# Altium footprint library SAMTEC THD.PcbLib: 161 footprints (part 3 of 12)
Each footprint in its own frame and in the unit in brackets; x right, y up, seen from the top. Pads: shape width x height; smd on the part's side, far side on the other; paste and mask are expansions set on the pad; w line width, h text height; cw(c..) or ccw(c..) is an arc to the next point about the centre after c.
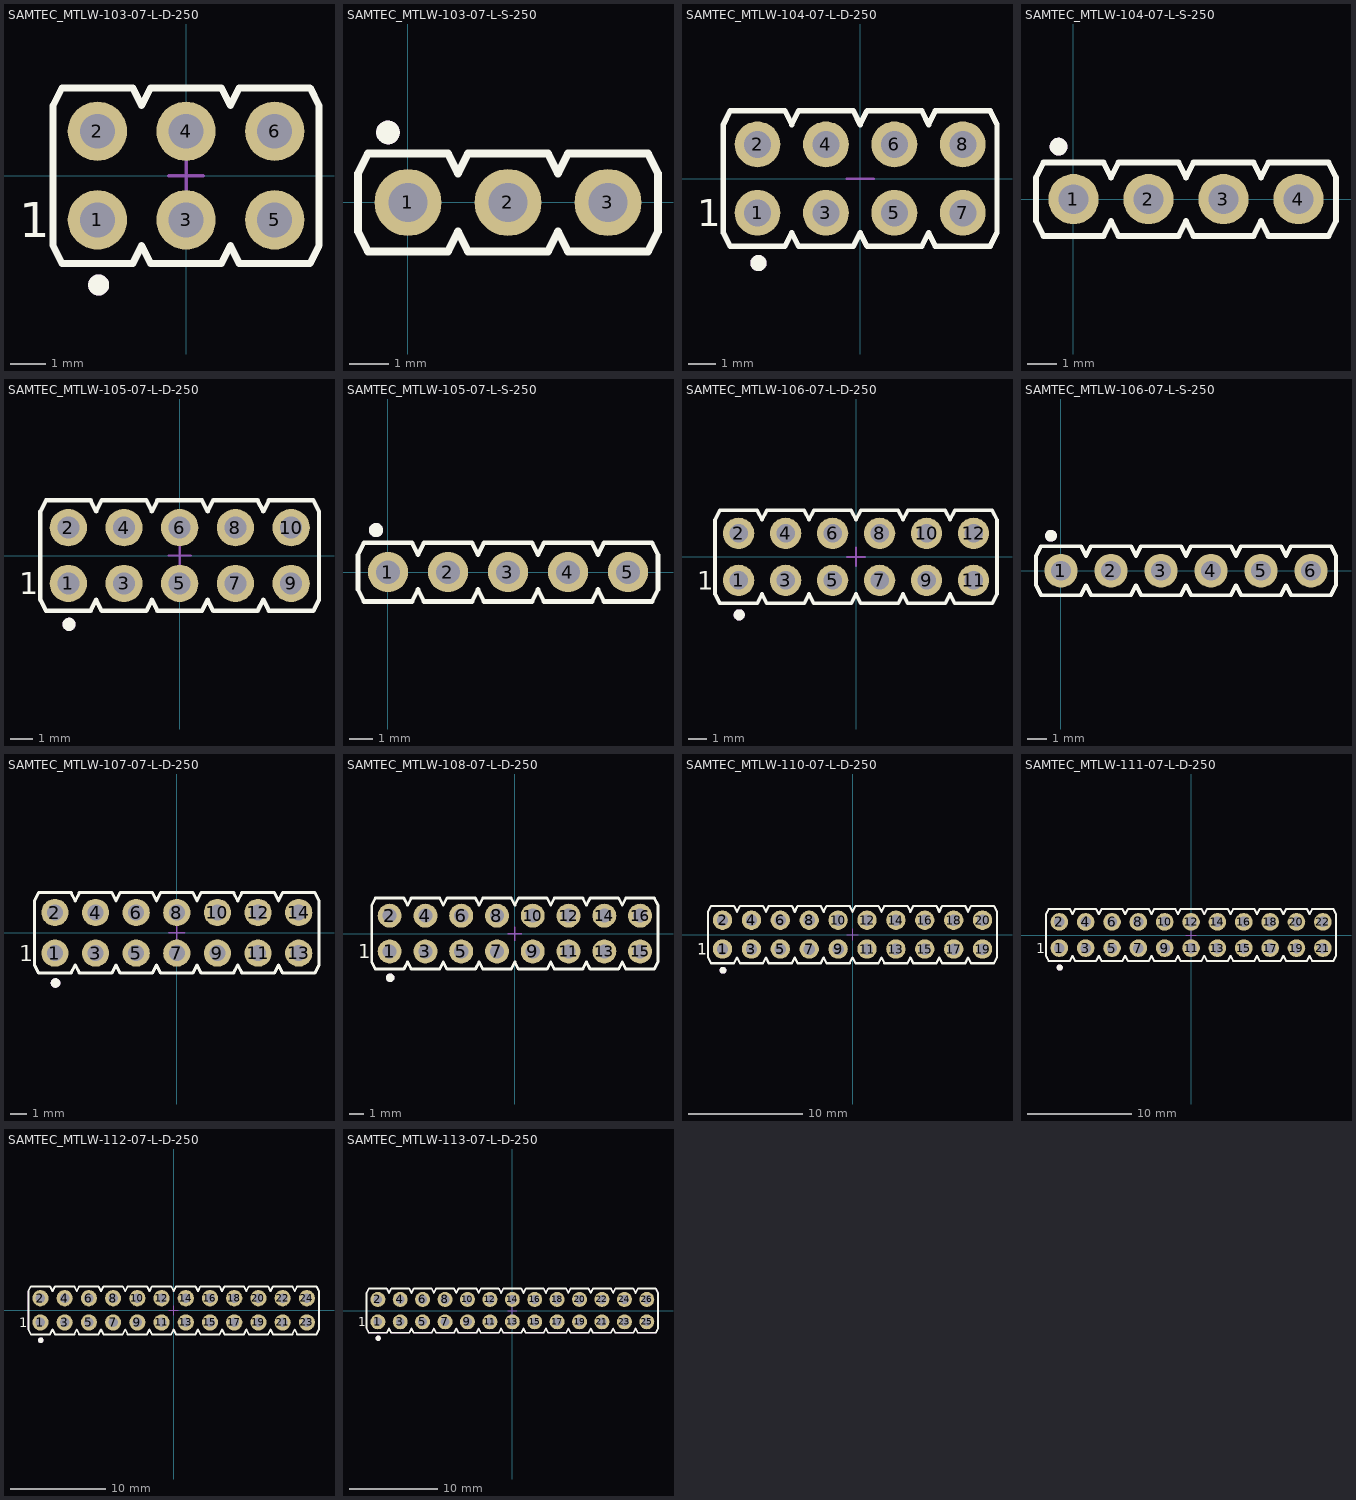
[diagram p2: the footprints below, top view; thin cyan lines are the x and y axes]

## SAMTEC_MTLW-103-07-L-D-250 [mm] "6 Contacts - Pitch 2.54mm - Dual Row Through Mount Straight Header (Post Lead = 6.35mm, Tail Lead 3.05mm, Insulator 1.52mm)"
height 7.87
pads (6):
  round 1.7 hole 1: 1(-2.54,-1.27) 2(-2.54,1.27) 3(0,-1.27) 4(0,1.27) 5(2.54,-1.27) 6(2.54,1.27)
Top Overlay:
  circle w0.3: c-2.505,-3.135 r0.15
  lines w0.2: 3.81,-2.007 3.81,2.007 ; 3.81,-2.007 3.556,-2.515 1.524,-2.515 1.27,-2.007 1.016,-2.515 -1.016,-2.515 -1.27,-2.007 -1.524,-2.515 -3.556,-2.515 -3.81,-2.007 -3.81,2.007 -3.556,2.515 -1.524,2.515 -1.27,2.007 -1.016,2.515 1.016,2.515 1.27,2.007 1.524,2.515 3.556,2.515 3.81,2.007 ; 3.81,-2.007 3.81,2.007
  text "1" at -4.787,-1.768 h1
Mechanical 8:
  lines w0.1: -3.04,-1.27 -2.54,-1.27 ; -3.04,1.27 -2.54,1.27 ; -2.54,-1.77 -2.54,-1.27 ; -2.54,-0.77 -2.54,-1.27 ; -2.54,0.77 -2.54,1.27 ; -2.54,1.77 -2.54,1.27 ; -2.04,-1.27 -2.54,-1.27 ; -2.04,1.27 -2.54,1.27 ; -0.5,-1.27 0,-1.27 ; -0.5,0 0,0 ; -0.5,1.27 0,1.27 ; 0,-1.77 0,-1.27 ; 0,-0.77 0,-1.27 ; 0,-0.5 0,0 ; 0,0.5 0,0 ; 0,0.77 0,1.27 ; 0,1.77 0,1.27 ; 0.5,-1.27 0,-1.27 ; 0.5,0 0,0 ; 0.5,1.27 0,1.27 ; 2.04,-1.27 2.54,-1.27 ; 2.04,1.27 2.54,1.27 ; 2.54,-1.77 2.54,-1.27 ; 2.54,-0.77 2.54,-1.27 ; 2.54,0.77 2.54,1.27 ; 2.54,1.77 2.54,1.27 ; 3.04,-1.27 2.54,-1.27 ; 3.04,1.27 2.54,1.27
Mechanical 14:
  circle w0.3: c-2.505,-3.135 r0.15
  lines w0.1: 3.81,-2.007 3.81,2.007 ; 3.81,-2.007 3.556,-2.515 1.524,-2.515 1.27,-2.007 1.016,-2.515 -1.016,-2.515 -1.27,-2.007 -1.524,-2.515 -3.556,-2.515 -3.81,-2.007 -3.81,2.007 -3.556,2.515 -1.524,2.515 -1.27,2.007 -1.016,2.515 1.016,2.515 1.27,2.007 1.524,2.515 3.556,2.515 3.81,2.007 ; 3.81,-2.007 3.81,2.007 ; -2.858,-1.587 -2.222,-1.587 -2.222,-0.953 -2.858,-0.953 -2.858,-1.587 ; -2.858,0.953 -2.222,0.953 -2.222,1.587 -2.858,1.587 -2.858,0.953 ; -0.318,-1.587 0.318,-1.587 0.318,-0.953 -0.318,-0.953 -0.318,-1.587 ; -0.318,0.953 0.318,0.953 0.318,1.587 -0.318,1.587 -0.318,0.953 ; 2.222,-1.587 2.858,-1.587 2.858,-0.953 2.222,-0.953 2.222,-1.587 ; 2.222,0.953 2.858,0.953 2.858,1.587 2.222,1.587 2.222,0.953
  text "1" at -4.787,-1.768 h1
3D body "SAMTEC_MTLW-103-07-L-D-250.stp": height 7.87, standoff -3.05, extent -3.81,-2.514 3.81,2.515

## SAMTEC_MTLW-103-07-L-S-250 [mm] "3 Contacts - Pitch 2.54mm - Single Row Through Mount Straight Header (Post Lead = 6.35mm, Tail Lead 3.05mm, Insulator 1.52mm)"
height 7.87
pads (3):
  round 1.7 hole 1: 1(0,0) 2(2.54,0) 3(5.08,0)
Top Overlay:
  circle w0.3: c-0.508,1.778 r0.15
  lines w0.2: -1.27,-0.737 -1.016,-1.245 1.016,-1.245 1.27,-0.737 1.524,-1.245 3.556,-1.245 3.81,-0.737 4.064,-1.245 6.096,-1.245 6.35,-0.737 6.35,0.737 6.096,1.245 4.064,1.245 3.81,0.737 3.556,1.245 1.524,1.245 1.27,0.737 1.016,1.245 -1.016,1.245 -1.27,0.737 -1.27,-0.737
Mechanical 8:
  lines w0.1: -0.5,0 0,0 ; 0,-0.5 0,0 ; 0,0.5 0,0 ; 0.5,0 0,0 ; 2.04,0 2.54,0 ; 2.54,-0.5 2.54,0 ; 2.54,0.5 2.54,0 ; 3.04,0 2.54,0 ; 4.58,0 5.08,0 ; 5.08,-0.5 5.08,0 ; 5.08,0.5 5.08,0 ; 5.58,0 5.08,0
Mechanical 14:
  circle w0.3: c-0.508,1.778 r0.15
  lines w0.1: -1.27,-0.737 -1.27,0.737 -1.016,1.245 1.016,1.245 1.27,0.737 1.524,1.245 3.556,1.245 3.81,0.737 4.064,1.245 6.096,1.245 6.35,0.737 6.35,-0.737 6.096,-1.245 4.064,-1.245 3.81,-0.737 3.556,-1.245 1.524,-1.245 1.27,-0.737 1.016,-1.245 -1.016,-1.245 -1.27,-0.737 ; -0.317,-0.318 -0.317,0.318 0.318,0.318 0.318,-0.318 -0.317,-0.318 ; 2.223,-0.318 2.223,0.318 2.858,0.318 2.858,-0.318 2.223,-0.318 ; 4.763,-0.318 4.763,0.318 5.398,0.318 5.398,-0.318 4.763,-0.318
3D body "SAMTEC_MTLW-103-07-L-S-250.stp": height 7.87, standoff -3.05, extent -1.27,-1.244 6.35,1.245

## SAMTEC_MTLW-104-07-L-D-250 [mm] "8 Contacts - Pitch 2.54mm - Dual Row Through Mount Straight Header (Post Lead = 6.35mm, Tail Lead 3.05mm, Insulator 1.52mm)"
height 7.87
pads (8):
  round 1.7 hole 1: 1(-3.81,-1.27) 2(-3.81,1.27) 3(-1.27,-1.27) 4(-1.27,1.27) 5(1.27,-1.27) 6(1.27,1.27) 7(3.81,-1.27) 8(3.81,1.27)
Top Overlay:
  circle w0.3: c-3.775,-3.135 r0.15
  lines w0.2: 5.08,-2.007 5.08,2.007 ; 5.08,-2.007 4.826,-2.515 2.794,-2.515 2.54,-2.007 2.286,-2.515 0.254,-2.515 0,-2.007 -0.254,-2.515 -2.286,-2.515 -2.54,-2.007 -2.794,-2.515 -4.826,-2.515 -5.08,-2.007 -5.08,2.007 -4.826,2.515 -2.794,2.515 -2.54,2.007 -2.286,2.515 -0.254,2.515 0,2.007 0.254,2.515 2.286,2.515 2.54,2.007 2.794,2.515 4.826,2.515 5.08,2.007 ; 5.08,-2.007 5.08,2.007
  text "1" at -6.057,-1.768 h1
Mechanical 8:
  lines w0.1: -4.31,-1.27 -3.81,-1.27 ; -4.31,1.27 -3.81,1.27 ; -3.81,-1.77 -3.81,-1.27 ; -3.81,-0.77 -3.81,-1.27 ; -3.81,0.77 -3.81,1.27 ; -3.81,1.77 -3.81,1.27 ; -3.31,-1.27 -3.81,-1.27 ; -3.31,1.27 -3.81,1.27 ; -1.77,-1.27 -1.27,-1.27 ; -1.77,1.27 -1.27,1.27 ; -1.27,-1.77 -1.27,-1.27 ; -1.27,-0.77 -1.27,-1.27 ; -1.27,0.77 -1.27,1.27 ; -1.27,1.77 -1.27,1.27 ; -0.77,-1.27 -1.27,-1.27 ; -0.77,1.27 -1.27,1.27 ; -0.5,0 0,0 0.5,0 ; 0.77,-1.27 1.27,-1.27 ; 0.77,1.27 1.27,1.27 ; 1.27,-1.77 1.27,-1.27 ; 1.27,-0.77 1.27,-1.27 ; 1.27,0.77 1.27,1.27 ; 1.27,1.77 1.27,1.27 ; 1.77,-1.27 1.27,-1.27 ; 1.77,1.27 1.27,1.27 ; 3.31,-1.27 3.81,-1.27 ; 3.31,1.27 3.81,1.27 ; 3.81,-1.77 3.81,-1.27 ; 3.81,-0.77 3.81,-1.27 ; 3.81,0.77 3.81,1.27 ; 3.81,1.77 3.81,1.27 ; 4.31,-1.27 3.81,-1.27 ; 4.31,1.27 3.81,1.27
Mechanical 14:
  circle w0.3: c-3.775,-3.135 r0.15
  lines w0.1: 5.08,-2.007 5.08,2.007 ; 5.08,-2.007 4.826,-2.515 2.794,-2.515 2.54,-2.007 2.286,-2.515 0.254,-2.515 0,-2.007 -0.254,-2.515 -2.286,-2.515 -2.54,-2.007 -2.794,-2.515 -4.826,-2.515 -5.08,-2.007 -5.08,2.007 -4.826,2.515 -2.794,2.515 -2.54,2.007 -2.286,2.515 -0.254,2.515 0,2.007 0.254,2.515 2.286,2.515 2.54,2.007 2.794,2.515 4.826,2.515 5.08,2.007 ; 5.08,-2.007 5.08,2.007 ; -4.128,-1.587 -4.128,-0.953 -3.493,-0.953 -3.493,-1.587 -4.128,-1.587 ; -4.128,0.953 -4.128,1.587 -3.493,1.587 -3.493,0.953 -4.128,0.953 ; -1.587,-1.587 -1.587,-0.953 -0.953,-0.953 -0.953,-1.587 -1.587,-1.587 ; -1.587,0.953 -1.587,1.587 -0.953,1.587 -0.953,0.953 -1.587,0.953 ; 0.953,-1.587 0.953,-0.953 1.587,-0.953 1.587,-1.587 0.953,-1.587 ; 0.953,0.953 0.953,1.587 1.587,1.587 1.587,0.953 0.953,0.953 ; 3.493,-1.587 3.493,-0.953 4.128,-0.953 4.128,-1.587 3.493,-1.587 ; 3.493,0.953 3.493,1.587 4.128,1.587 4.128,0.953 3.493,0.953
  text "1" at -6.057,-1.768 h1
3D body "SAMTEC_MTLW-104-07-L-D-250.stp": height 7.87, standoff -3.05, extent -5.08,-2.514 5.08,2.515

## SAMTEC_MTLW-104-07-L-S-250 [mm] "4 Contacts - Pitch 2.54mm - Single Row Through Mount Straight Header (Post Lead = 6.35mm, Tail Lead 3.05mm, Insulator 1.52mm)"
height 7.87
pads (4):
  round 1.7 hole 1: 1(0,0) 2(2.54,0) 3(5.08,0) 4(7.62,0)
Top Overlay:
  circle w0.3: c-0.508,1.778 r0.15
  lines w0.2: -1.27,-0.737 -1.27,0.737 -1.016,1.245 1.016,1.245 1.27,0.737 1.524,1.245 3.556,1.245 3.81,0.737 4.064,1.245 6.096,1.245 6.35,0.737 6.604,1.245 8.636,1.245 8.89,0.737 8.89,-0.737 8.636,-1.245 6.604,-1.245 6.35,-0.737 6.096,-1.245 4.064,-1.245 3.81,-0.737 3.556,-1.245 1.524,-1.245 1.27,-0.737 1.016,-1.245 -1.016,-1.245 -1.27,-0.737
Mechanical 8:
  lines w0.1: -0.5,0 0,0 ; 0,-0.5 0,0 ; 0,0.5 0,0 ; 0.5,0 0,0 ; 2.04,0 2.54,0 ; 2.54,-0.5 2.54,0 ; 2.54,0.5 2.54,0 ; 3.04,0 2.54,0 ; 4.58,0 5.08,0 ; 5.08,-0.5 5.08,0 ; 5.08,0.5 5.08,0 ; 5.58,0 5.08,0 ; 7.12,0 7.62,0 ; 7.62,-0.5 7.62,0 ; 7.62,0.5 7.62,0 ; 8.12,0 7.62,0
Mechanical 14:
  circle w0.3: c-0.508,1.778 r0.15
  lines w0.1: -1.27,-0.737 -1.016,-1.245 1.016,-1.245 1.27,-0.737 1.524,-1.245 3.556,-1.245 3.81,-0.737 4.064,-1.245 6.096,-1.245 6.35,-0.737 6.604,-1.245 8.636,-1.245 8.89,-0.737 8.89,0.737 8.636,1.245 6.604,1.245 6.35,0.737 6.096,1.245 4.064,1.245 3.81,0.737 3.556,1.245 1.524,1.245 1.27,0.737 1.016,1.245 -1.016,1.245 -1.27,0.737 -1.27,-0.737 ; -0.317,-0.318 0.318,-0.318 0.318,0.318 -0.317,0.318 -0.317,-0.318 ; 2.223,-0.318 2.858,-0.318 2.858,0.318 2.223,0.318 2.223,-0.318 ; 4.763,-0.318 5.398,-0.318 5.398,0.318 4.763,0.318 4.763,-0.318 ; 7.303,-0.318 7.938,-0.318 7.938,0.318 7.303,0.318 7.303,-0.318
3D body "SAMTEC_MTLW-104-07-L-S-250.stp": height 7.87, standoff -3.05, extent -1.27,-1.244 8.89,1.245

## SAMTEC_MTLW-105-07-L-D-250 [mm] "10 Contacts - Pitch 2.54mm - Dual Row Through Mount Straight Header (Post Lead = 6.35mm, Tail Lead 3.05mm, Insulator 1.52mm)"
height 7.87
pads (10):
  round 1.7 hole 1: 1(-5.08,-1.27) 2(-5.08,1.27) 3(-2.54,-1.27) 4(-2.54,1.27) 5(0,-1.27) 6(0,1.27) 7(2.54,-1.27) 8(2.54,1.27) 9(5.08,-1.27) 10(5.08,1.27)
Top Overlay:
  circle w0.3: c-5.045,-3.135 r0.15
  lines w0.2: -6.35,-2.007 -6.096,-2.515 -4.064,-2.515 -3.81,-2.007 -3.556,-2.515 -1.524,-2.515 -1.27,-2.007 -1.016,-2.515 1.016,-2.515 1.27,-2.007 1.524,-2.515 3.556,-2.515 3.81,-2.007 4.064,-2.515 6.096,-2.515 6.35,-2.007 6.35,2.007 6.096,2.515 4.064,2.515 3.81,2.007 3.556,2.515 1.524,2.515 1.27,2.007 1.016,2.515 -1.016,2.515 -1.27,2.007 -1.524,2.515 -3.556,2.515 -3.81,2.007 -4.064,2.515 -6.096,2.515 -6.35,2.007 -6.35,-2.007
  text "1" at -7.327,-1.768 h1
Mechanical 8:
  lines w0.1: -5.58,-1.27 -5.08,-1.27 ; -5.58,1.27 -5.08,1.27 ; -5.08,-1.77 -5.08,-1.27 ; -5.08,-0.77 -5.08,-1.27 ; -5.08,0.77 -5.08,1.27 ; -5.08,1.77 -5.08,1.27 ; -4.58,-1.27 -5.08,-1.27 ; -4.58,1.27 -5.08,1.27 ; -3.04,-1.27 -2.54,-1.27 ; -3.04,1.27 -2.54,1.27 ; -2.54,-1.77 -2.54,-1.27 ; -2.54,-0.77 -2.54,-1.27 ; -2.54,0.77 -2.54,1.27 ; -2.54,1.77 -2.54,1.27 ; -2.04,-1.27 -2.54,-1.27 ; -2.04,1.27 -2.54,1.27 ; -0.5,-1.27 0,-1.27 ; -0.5,0 0,0 ; -0.5,1.27 0,1.27 ; 0,-1.77 0,-1.27 ; 0,-0.77 0,-1.27 ; 0,-0.5 0,0 ; 0,0.5 0,0 ; 0,0.77 0,1.27 ; 0,1.77 0,1.27 ; 0.5,-1.27 0,-1.27 ; 0.5,0 0,0 ; 0.5,1.27 0,1.27 ; 2.04,-1.27 2.54,-1.27 ; 2.04,1.27 2.54,1.27 ; 2.54,-1.77 2.54,-1.27 ; 2.54,-0.77 2.54,-1.27 ; 2.54,0.77 2.54,1.27 ; 2.54,1.77 2.54,1.27 ; 3.04,-1.27 2.54,-1.27 ; 3.04,1.27 2.54,1.27 ; 4.58,-1.27 5.08,-1.27 ; 4.58,1.27 5.08,1.27 ; 5.08,-1.77 5.08,-1.27 ; 5.08,-0.77 5.08,-1.27 ; 5.08,0.77 5.08,1.27 ; 5.08,1.77 5.08,1.27 ; 5.58,-1.27 5.08,-1.27 ; 5.58,1.27 5.08,1.27
Mechanical 14:
  circle w0.3: c-5.045,-3.135 r0.15
  lines w0.1: -6.35,-2.007 -6.096,-2.515 -4.064,-2.515 -3.81,-2.007 -3.556,-2.515 -1.524,-2.515 -1.27,-2.007 -1.016,-2.515 1.016,-2.515 1.27,-2.007 1.524,-2.515 3.556,-2.515 3.81,-2.007 4.064,-2.515 6.096,-2.515 6.35,-2.007 6.35,2.007 6.096,2.515 4.064,2.515 3.81,2.007 3.556,2.515 1.524,2.515 1.27,2.007 1.016,2.515 -1.016,2.515 -1.27,2.007 -1.524,2.515 -3.556,2.515 -3.81,2.007 -4.064,2.515 -6.096,2.515 -6.35,2.007 -6.35,-2.007 ; -5.397,-1.587 -4.762,-1.587 -4.762,-0.953 -5.397,-0.953 -5.397,-1.587 ; -5.397,0.953 -4.762,0.953 -4.762,1.587 -5.397,1.587 -5.397,0.953 ; -2.857,-1.587 -2.222,-1.587 -2.222,-0.953 -2.857,-0.953 -2.857,-1.587 ; -2.857,0.953 -2.222,0.953 -2.222,1.587 -2.857,1.587 -2.857,0.953 ; -0.317,-1.587 0.318,-1.587 0.318,-0.953 -0.317,-0.953 -0.317,-1.587 ; -0.317,0.953 0.318,0.953 0.318,1.587 -0.317,1.587 -0.317,0.953 ; 2.223,-1.587 2.858,-1.587 2.858,-0.953 2.223,-0.953 2.223,-1.587 ; 2.223,0.953 2.858,0.953 2.858,1.587 2.223,1.587 2.223,0.953 ; 4.763,-1.587 5.398,-1.587 5.398,-0.953 4.763,-0.953 4.763,-1.587 ; 4.763,0.953 5.398,0.953 5.398,1.587 4.763,1.587 4.763,0.953
  text "1" at -7.327,-1.768 h1
3D body "SAMTEC_MTLW-105-07-L-D-250.stp": height 7.87, standoff -3.05, extent -6.35,-2.514 6.35,2.515

## SAMTEC_MTLW-105-07-L-S-250 [mm] "5 Contacts - Pitch 2.54mm - Single Row Through Mount Straight Header (Post Lead = 6.35mm, Tail Lead 3.05mm, Insulator 1.52mm)"
height 7.87
pads (5):
  round 1.7 hole 1: 1(0,0) 2(2.54,0) 3(5.08,0) 4(7.62,0) 5(10.16,0)
Top Overlay:
  circle w0.3: c-0.508,1.778 r0.15
  lines w0.2: -1.27,-0.737 -1.27,0.737 -1.016,1.245 1.016,1.245 1.27,0.737 1.524,1.245 3.556,1.245 3.81,0.737 4.064,1.245 6.096,1.245 6.35,0.737 6.604,1.245 8.636,1.245 8.89,0.737 9.144,1.245 11.176,1.245 11.43,0.737 11.43,-0.737 11.176,-1.245 9.144,-1.245 8.89,-0.737 8.636,-1.245 6.604,-1.245 6.35,-0.737 6.096,-1.245 4.064,-1.245 3.81,-0.737 3.556,-1.245 1.524,-1.245 1.27,-0.737 1.016,-1.245 -1.016,-1.245 -1.27,-0.737
Mechanical 8:
  lines w0.1: -0.5,0 0,0 ; 0,-0.5 0,0 ; 0,0.5 0,0 ; 0.5,0 0,0 ; 2.04,0 2.54,0 ; 2.54,-0.5 2.54,0 ; 2.54,0.5 2.54,0 ; 3.04,0 2.54,0 ; 4.58,0 5.08,0 ; 5.08,-0.5 5.08,0 ; 5.08,0.5 5.08,0 ; 5.58,0 5.08,0 ; 7.12,0 7.62,0 ; 7.62,-0.5 7.62,0 ; 7.62,0.5 7.62,0 ; 8.12,0 7.62,0 ; 9.66,0 10.16,0 ; 10.16,-0.5 10.16,0 ; 10.16,0.5 10.16,0 ; 10.66,0 10.16,0
Mechanical 14:
  circle w0.3: c-0.508,1.778 r0.15
  lines w0.1: -1.27,-0.737 -1.27,0.737 -1.016,1.245 1.016,1.245 1.27,0.737 1.524,1.245 3.556,1.245 3.81,0.737 4.064,1.245 6.096,1.245 6.35,0.737 6.604,1.245 8.636,1.245 8.89,0.737 9.144,1.245 11.176,1.245 11.43,0.737 11.43,-0.737 11.176,-1.245 9.144,-1.245 8.89,-0.737 8.636,-1.245 6.604,-1.245 6.35,-0.737 6.096,-1.245 4.064,-1.245 3.81,-0.737 3.556,-1.245 1.524,-1.245 1.27,-0.737 1.016,-1.245 -1.016,-1.245 -1.27,-0.737 ; -0.317,-0.318 -0.317,0.318 0.318,0.318 0.318,-0.318 -0.317,-0.318 ; 2.223,-0.318 2.223,0.318 2.858,0.318 2.858,-0.318 2.223,-0.318 ; 4.763,-0.318 4.763,0.318 5.398,0.318 5.398,-0.318 4.763,-0.318 ; 7.303,-0.318 7.303,0.318 7.938,0.318 7.938,-0.318 7.303,-0.318 ; 9.843,-0.318 10.478,-0.318 10.478,0.318 9.843,0.318 9.843,-0.318
3D body "SAMTEC_MTLW-105-07-L-S-250.stp": height 7.87, standoff -3.05, extent -1.27,-1.244 11.43,1.245

## SAMTEC_MTLW-106-07-L-D-250 [mm] "12 Contacts - Pitch 2.54mm - Dual Row Through Mount Straight Header (Post Lead = 6.35mm, Tail Lead 3.05mm, Insulator 1.52mm)"
height 7.87
pads (12):
  round 1.7 hole 1: 1(-6.35,-1.27) 2(-6.35,1.27) 3(-3.81,-1.27) 4(-3.81,1.27) 5(-1.27,-1.27) 6(-1.27,1.27) 7(1.27,-1.27) 8(1.27,1.27) 9(3.81,-1.27) 10(3.81,1.27) 11(6.35,-1.27) 12(6.35,1.27)
Top Overlay:
  circle w0.3: c-6.315,-3.135 r0.15
  lines w0.2: -7.62,-2.007 -7.366,-2.515 -5.334,-2.515 -5.08,-2.007 -4.826,-2.515 -2.794,-2.515 -2.54,-2.007 -2.286,-2.515 -0.254,-2.515 0,-2.007 0.254,-2.515 2.286,-2.515 2.54,-2.007 2.794,-2.515 4.826,-2.515 5.08,-2.007 5.334,-2.515 7.366,-2.515 7.62,-2.007 ; -7.62,-2.007 -7.62,2.007 ; -7.62,-2.007 -7.62,2.007 ; -7.62,2.007 -7.366,2.515 -5.334,2.515 -5.08,2.007 -4.826,2.515 -2.794,2.515 -2.54,2.007 -2.286,2.515 -0.254,2.515 0,2.007 0.254,2.515 2.286,2.515 2.54,2.007 2.794,2.515 4.826,2.515 5.08,2.007 5.334,2.515 7.366,2.515 7.62,2.007 ; 7.62,-2.007 7.62,2.007 ; 7.62,-2.007 7.62,2.007
  text "1" at -8.597,-1.768 h1
Mechanical 8:
  lines w0.1: -6.85,-1.27 -6.35,-1.27 ; -6.85,1.27 -6.35,1.27 ; -6.35,-1.77 -6.35,-1.27 ; -6.35,-0.77 -6.35,-1.27 ; -6.35,0.77 -6.35,1.27 ; -6.35,1.77 -6.35,1.27 ; -5.85,-1.27 -6.35,-1.27 ; -5.85,1.27 -6.35,1.27 ; -4.31,-1.27 -3.81,-1.27 ; -4.31,1.27 -3.81,1.27 ; -3.81,-1.77 -3.81,-1.27 ; -3.81,-0.77 -3.81,-1.27 ; -3.81,0.77 -3.81,1.27 ; -3.81,1.77 -3.81,1.27 ; -3.31,-1.27 -3.81,-1.27 ; -3.31,1.27 -3.81,1.27 ; -1.77,-1.27 -1.27,-1.27 ; -1.77,1.27 -1.27,1.27 ; -1.27,-1.77 -1.27,-1.27 ; -1.27,-0.77 -1.27,-1.27 ; -1.27,0.77 -1.27,1.27 ; -1.27,1.77 -1.27,1.27 ; -0.77,-1.27 -1.27,-1.27 ; -0.77,1.27 -1.27,1.27 ; -0.5,0 0,0 ; 0,-0.5 0,0 ; 0,0.5 0,0 ; 0.5,0 0,0 ; 0.77,-1.27 1.27,-1.27 ; 0.77,1.27 1.27,1.27 ; 1.27,-1.77 1.27,-1.27 ; 1.27,-0.77 1.27,-1.27 ; 1.27,0.77 1.27,1.27 ; 1.27,1.77 1.27,1.27 ; 1.77,-1.27 1.27,-1.27 ; 1.77,1.27 1.27,1.27 ; 3.31,-1.27 3.81,-1.27 ; 3.31,1.27 3.81,1.27 ; 3.81,-1.77 3.81,-1.27 ; 3.81,-0.77 3.81,-1.27 ; 3.81,0.77 3.81,1.27 ; 3.81,1.77 3.81,1.27 ; 4.31,-1.27 3.81,-1.27 ; 4.31,1.27 3.81,1.27 ; 5.85,-1.27 6.35,-1.27 ; 5.85,1.27 6.35,1.27 ; 6.35,-1.77 6.35,-1.27 ; 6.35,-0.77 6.35,-1.27 ; 6.35,0.77 6.35,1.27 ; 6.35,1.77 6.35,1.27 ; 6.85,-1.27 6.35,-1.27 ; 6.85,1.27 6.35,1.27
Mechanical 14:
  circle w0.3: c-6.315,-3.135 r0.15
  lines w0.1: 7.62,-2.007 7.366,-2.515 5.334,-2.515 5.08,-2.007 4.826,-2.515 2.794,-2.515 2.54,-2.007 2.286,-2.515 0.254,-2.515 0,-2.007 -0.254,-2.515 -2.286,-2.515 -2.54,-2.007 -2.794,-2.515 -4.826,-2.515 -5.08,-2.007 -5.334,-2.515 -7.366,-2.515 -7.62,-2.007 ; 7.62,2.007 7.366,2.515 5.334,2.515 5.08,2.007 4.826,2.515 2.794,2.515 2.54,2.007 2.286,2.515 0.254,2.515 0,2.007 -0.254,2.515 -2.286,2.515 -2.54,2.007 -2.794,2.515 -4.826,2.515 -5.08,2.007 -5.334,2.515 -7.366,2.515 -7.62,2.007 ; -7.62,-2.007 -7.62,2.007 ; -7.62,-2.007 -7.62,2.007 ; -6.667,-1.587 -6.032,-1.587 -6.032,-0.953 -6.667,-0.953 -6.667,-1.587 ; -6.667,0.953 -6.032,0.953 -6.032,1.587 -6.667,1.587 -6.667,0.953 ; -4.127,-1.587 -3.492,-1.587 -3.492,-0.953 -4.127,-0.953 -4.127,-1.587 ; -4.127,0.953 -3.492,0.953 -3.492,1.587 -4.127,1.587 -4.127,0.953 ; -1.587,-1.587 -0.952,-1.587 -0.952,-0.953 -1.587,-0.953 -1.587,-1.587 ; -1.587,0.953 -0.952,0.953 -0.952,1.587 -1.587,1.587 -1.587,0.953 ; 0.953,-1.587 1.588,-1.587 1.588,-0.953 0.953,-0.953 0.953,-1.587 ; 0.953,0.953 1.588,0.953 1.588,1.587 0.953,1.587 0.953,0.953 ; 3.493,-1.587 4.128,-1.587 4.128,-0.953 3.493,-0.953 3.493,-1.587 ; 3.493,0.953 4.128,0.953 4.128,1.587 3.493,1.587 3.493,0.953 ; 6.033,-1.587 6.668,-1.587 6.668,-0.953 6.033,-0.953 6.033,-1.587 ; 6.033,0.953 6.668,0.953 6.668,1.587 6.033,1.587 6.033,0.953
  text "1" at -8.597,-1.768 h1
3D body "SAMTEC_MTLW-106-07-L-D-250.stp": height 7.87, standoff -3.05, extent -7.62,-2.514 7.62,2.515

## SAMTEC_MTLW-106-07-L-S-250 [mm] "6 Contacts - Pitch 2.54mm - Single Row Through Mount Straight Header (Post Lead = 6.35mm, Tail Lead 3.05mm, Insulator 1.52mm)"
height 7.87
pads (6):
  round 1.7 hole 1: 1(0,0) 2(2.54,0) 3(5.08,0) 4(7.62,0) 5(10.16,0) 6(12.7,0)
Top Overlay:
  circle w0.3: c-0.508,1.778 r0.15
  lines w0.2: -1.27,-0.737 -1.016,-1.245 1.016,-1.245 1.27,-0.737 1.524,-1.245 3.556,-1.245 3.81,-0.737 4.064,-1.245 6.096,-1.245 6.35,-0.737 6.604,-1.245 8.636,-1.245 8.89,-0.737 9.144,-1.245 11.176,-1.245 11.43,-0.737 11.684,-1.245 13.716,-1.245 13.97,-0.737 13.97,0.737 13.716,1.245 11.684,1.245 11.43,0.737 11.176,1.245 9.144,1.245 8.89,0.737 8.636,1.245 6.604,1.245 6.35,0.737 6.096,1.245 4.064,1.245 3.81,0.737 3.556,1.245 1.524,1.245 1.27,0.737 1.016,1.245 -1.016,1.245 -1.27,0.737 -1.27,-0.737
Mechanical 8:
  lines w0.1: -0.5,0 0,0 ; 0,-0.5 0,0 ; 0,0.5 0,0 ; 0.5,0 0,0 ; 2.04,0 2.54,0 ; 2.54,-0.5 2.54,0 ; 2.54,0.5 2.54,0 ; 3.04,0 2.54,0 ; 4.58,0 5.08,0 ; 5.08,-0.5 5.08,0 ; 5.08,0.5 5.08,0 ; 5.58,0 5.08,0 ; 7.12,0 7.62,0 ; 7.62,-0.5 7.62,0 ; 7.62,0.5 7.62,0 ; 8.12,0 7.62,0 ; 9.66,0 10.16,0 ; 10.16,-0.5 10.16,0 ; 10.16,0.5 10.16,0 ; 10.66,0 10.16,0 ; 12.2,0 12.7,0 ; 12.7,-0.5 12.7,0 ; 12.7,0.5 12.7,0 ; 13.2,0 12.7,0
Mechanical 14:
  circle w0.3: c-0.508,1.778 r0.15
  lines w0.1: -1.27,-0.737 -1.016,-1.245 1.016,-1.245 1.27,-0.737 1.524,-1.245 3.556,-1.245 3.81,-0.737 4.064,-1.245 6.096,-1.245 6.35,-0.737 6.604,-1.245 8.636,-1.245 8.89,-0.737 9.144,-1.245 11.176,-1.245 11.43,-0.737 11.684,-1.245 13.716,-1.245 13.97,-0.737 13.97,0.737 13.716,1.245 11.684,1.245 11.43,0.737 11.176,1.245 9.144,1.245 8.89,0.737 8.636,1.245 6.604,1.245 6.35,0.737 6.096,1.245 4.064,1.245 3.81,0.737 3.556,1.245 1.524,1.245 1.27,0.737 1.016,1.245 -1.016,1.245 -1.27,0.737 -1.27,-0.737 ; -0.317,-0.318 0.318,-0.318 0.318,0.318 -0.317,0.318 -0.317,-0.318 ; 2.223,-0.318 2.858,-0.318 2.858,0.318 2.223,0.318 2.223,-0.318 ; 4.763,-0.318 5.398,-0.318 5.398,0.318 4.763,0.318 4.763,-0.318 ; 7.303,-0.318 7.938,-0.318 7.938,0.318 7.303,0.318 7.303,-0.318 ; 9.843,-0.318 9.843,0.318 10.478,0.318 10.478,-0.318 9.843,-0.318 ; 12.383,-0.318 12.383,0.318 13.018,0.318 13.018,-0.318 12.383,-0.318
3D body "SAMTEC_MTLW-106-07-L-S-250.stp": height 7.87, standoff -3.05, extent -1.27,-1.244 13.97,1.245
